# Altium schematic symbol library AD_Lib.SchLib: 1239 symbols (part 7 of 9) (continued)
## R0805_680/150V@2
designator R?, comment 680¦¸,0.125W
ÌùÆ¬µç×è; Manufacturer: Panasonic; pro-environment: RoHS; Quality: -55~155¡æ; other: 680¦¸,0.125W,1%,150V; OPN: ERJ-6ENF6800V; PadsNum: 2; SN: SN; Category: µç×è; Part: ERJ-6ENF6800V; Value: 680¦¸,0.125W; Price: ?; OPN_JLC: 0805W8F6800T5E; SN_JLC: C17798; Price_JLC: 0
footprint R0805 (ÌùÆ¬µç×è£¬¹¦ÂÊ1/8W)
pins: 1, 2

## R0805_806/150V@3
designator R?, comment 806¦¸,0.125W
ÌùÆ¬µç×è; Manufacturer: Viking; pro-environment: RoHS; Quality: -55~155¡æ; other: 806¦¸,0.125W,1%,150V; OPN: ARG05FTC8060N; PadsNum: 2; SN: SN; Category: µç×è; Part: ARG05FTC8060N; Value: 806¦¸,0.125W; QTY: 5000; Price: 0.035102; OPN_JLC: ARG05FTC8060N; SN_JLC: C218702; Price_JLC: 0.035102
footprint R0805 (ÌùÆ¬µç×è£¬¹¦ÂÊ1/8W)
pins: 1, 2

## R1206_0.15/200V
designator R?, comment 0.15,0.25W
ÌùÆ¬µç×è; Manufacturer: Yageo; pro-environment: RoHS; Quality: -55~155¡æ; other: 0.15,0.25W,1%,200V; OPN: RL1206FR-070R15L; PadsNum: 2; SN: SN; Category: µç×è; Part: RL1206FR-070R15L; Value: 0.15,0.25W; QTY: 5000; Price: 0.08147; OPN_JLC: 1206W4F150LT5E; SN_JLC: C37936; Price_JLC: 0.04612
footprint R1206 (¹«ÖÆ3216£»Ó¢ÖÆ1206£»)
pins: 1, 2

## R1206_0.33/200V
designator R?, comment 0.33,0.25W
ÌùÆ¬µç×è; Manufacturer: Yageo; pro-environment: RoHS; Quality: -55~155¡æ; other: 0.15,0.25W,1%,200V; OPN: RL1206FR-070R33L; PadsNum: 2; SN: SN; Category: µç×è; Part: RL1206FR-070R33L; Value: 0.33,0.25W; QTY: 5000; Price: 0.093385; OPN_JLC: 1206W4F330LT5E; SN_JLC: C25337; Price_JLC: 0.047434
footprint R1206 (¹«ÖÆ3216£»Ó¢ÖÆ1206£»)
pins: 1, 2

## R1206_0/1kV
designator R?, comment 0¦¸,0.25W
ÌùÆ¬µç×è; Manufacturer: KOA; pro-environment: RoHS; Quality: -55~155¡æ; OPN: RK73Z2BTTD; PadsNum: 2; SN: SN; other: 0¦¸; Category: µç×è; Part: RK73Z2BTTD; Value: 0¦¸,0.25W; QTY: 5000; Price: 0.03861; OPN_JLC: 1206W4F0000T5E; SN_JLC: C17888; Price_JLC: 0
footprint R1206 (¹«ÖÆ3216£»Ó¢ÖÆ1206£»)
pins: 1, 2

## R1206_0/1kV@3
designator R?, comment 0¦¸
ÌùÆ¬µç×è; Manufacturer: Yageo; pro-environment: RoHS; Quality: -55~155¡æ; SN: 03.4.38.11.18000001S; OPN: RC1206FR-070RL; PadsNum: 2; other: 0¦¸; Category: µç×è; Part: RC1206FR-070RL; Value: 0¦¸; QTY: 5000; Price: 0.03276; OPN_JLC: 1206W4F0000T5E; SN_JLC: C17888; Price_JLC: 0
footprint R1206 (¹«ÖÆ3216£»Ó¢ÖÆ1206£»)
pins: 1, 2

## R1206_1.6/200V
designator R?, comment 1.6,0.25W
ÌùÆ¬µç×è; Manufacturer: Yageo; pro-environment: RoHS; Quality: -55~155¡æ; other: 1.6,0.25W,1%,200V; OPN: RC1206FR-071R6L; PadsNum: 2; SN: SN; Category: µç×è; Part: RC1206FR-071R6L; Value: 1.6,0.25W; QTY: 5000; Price: 0.049626; OPN_JLC: RC1206FR-071R6L; SN_JLC: C137358; Price_JLC: 0.049626
footprint R1206 (¹«ÖÆ3216£»Ó¢ÖÆ1206£»)
pins: 1, 2

## R1206_1/200V@3
designator R?, comment 1¦¸,0.25W
ÌùÆ¬µç×è; Manufacturer: Yageo; pro-environment: RoHS; Quality: -55~155¡æ; other: 1¦¸,0.25W,1%,200V; OPN: RC1206FR-071RL; PadsNum: 2; SN: SN; Category: µç×è; Part: RC1206FR-071RL; Value: 1¦¸,0.25W; QTY: 5000; Price: 0.04797; OPN_JLC: 1206W4F100KT5E; SN_JLC: C17928; Price_JLC: 0
footprint R1206 (¹«ÖÆ3216£»Ó¢ÖÆ1206£»)
pins: 1, 2

## R1206_1K/200V
designator R?, comment 1k¦¸,0.25W
ÌùÆ¬µç×è; Manufacturer: KOA; pro-environment: RoHS; Quality: -55~155¡æ; other: 1k¦¸,0.25W,1%,200V; OPN: RK73H2BTTD1001F; PadsNum: 2; SN: SN; Category: µç×è; Part: RK73H2BTTD1001F; Value: 1k¦¸,0.25W; QTY: 5000; Price: ?; OPN_JLC: 1206W4F1001T5E; SN_JLC: C4410; Price_JLC: 0
footprint R1206 (¹«ÖÆ3216£»Ó¢ÖÆ1206£»)
pins: 1, 2

## R1206_2.2K/200V
designator R?, comment 2.2k¦¸,0.25W
ÌùÆ¬µç×è; Manufacturer: KOA; Part: RK73H2BTTD2001F; pro-environment: RoHS; Quality: -55~155¡æ; other: 2.2k¦¸,0.25W,1%,200V; OPN: RK73H2BTTD2201F; PadsNum: 2; SN: SN; Category: µç×è; Value: 2.2k¦¸,0.25W; QTY: 5000; Price: 0.05424; OPN_JLC: RC1206FR-072K2L; SN_JLC: C114933; Price_JLC: 0.020038
footprint R1206 (¹«ÖÆ3216£»Ó¢ÖÆ1206£»)
pins: 1, 2

## R1206_2.21K/200V
designator R?, comment 2.21k¦¸,0.25W
ÌùÆ¬µç×è; Manufacturer: KOA; pro-environment: RoHS; Quality: -55~155¡æ; SN: 03.4.38.11.18022202S; other: 2.21k¦¸,0.25W,1%,200V; OPN: RK73H2BTTD2211F; PadsNum: 2; Category: µç×è; Part: RK73H2BTTD2211F; Value: 2.21k¦¸,0.25W; QTY: 5000; Price: 0.04797; OPN_JLC: OPN_JLC; SN_JLC: SN_JLC; Price_JLC: 0
footprint R1206 (¹«ÖÆ3216£»Ó¢ÖÆ1206£»)
pins: 1, 2

## R1206_2.87K/200V
designator R?, comment 2.87k¦¸,0.25W
ÌùÆ¬µç×è; Manufacturer: KOA; pro-environment: RoHS; Quality: -55~155¡æ; other: 2.87k¦¸,0.25W,1%,200V; OPN: RK73H2BTTD2871F; PadsNum: 2; SN: SN; Category: µç×è; Part: RK73H2BTTD2871F; Value: 2.87k¦¸,0.25W; QTY: 5000; Price: ?; OPN_JLC: OPN_JLC; SN_JLC: SN_JLC; Price_JLC: 0
footprint R1206 (¹«ÖÆ3216£»Ó¢ÖÆ1206£»)
pins: 1, 2

## R1206_2K/200V
designator R?, comment 2k¦¸,0.25W
ÌùÆ¬µç×è; Manufacturer: KOA; pro-environment: RoHS; Quality: -55~155¡æ; other: 2k¦¸,0.25W,1%,200V; OPN: RK73H2BTTD2001F; PadsNum: 2; SN: SN; Category: µç×è; Part: RK73H2BTTD2001F; Value: 2k¦¸,0.25W; QTY: 5000; Price: ?; OPN_JLC: 1206W4F2001T5E; SN_JLC: C17944; Price_JLC: 0
footprint R1206 (¹«ÖÆ3216£»Ó¢ÖÆ1206£»)
pins: 1, 2

## R1206_2K/200V@2
designator R?, comment 2k¦¸,0.25W
ÌùÆ¬µç×è; Manufacturer: Panasonic; pro-environment: RoHS; Quality: -55~155¡æ; other: 2k¦¸,0.25W,1%,200V; OPN: ERJ-8ENF2001V; PadsNum: 2; SN: SN; Category: µç×è; Part: ERJ-8ENF2001V; Value: 2k¦¸,0.25W; Price: ?; OPN_JLC: 1206W4F2001T5E; SN_JLC: C17944; Price_JLC: 0
footprint R1206 (¹«ÖÆ3216£»Ó¢ÖÆ1206£»)
pins: 1, 2

## R1206_2K/200V@3
designator R?, comment 2K¦¸,0.25W
ÌùÆ¬µç×è; Manufacturer: Yageo; pro-environment: RoHS; Quality: -55~155¡æ; other: 2K¦¸,0.25W,1%,200V; OPN: RC1206FR-072KL; PadsNum: 2; SN: SN; Category: µç×è; Part: RC1206FR-072KL; Value: 2K¦¸,0.25W; QTY: 5000; Price: ?; OPN_JLC: 1206W4F2001T5E; SN_JLC: C17944; Price_JLC: 0
footprint R1206 (¹«ÖÆ3216£»Ó¢ÖÆ1206£»)
pins: 1, 2

## R1206_3.3/200V
designator R?, comment 3.3¦¸,0.25W
ÌùÆ¬µç×è; Manufacturer: KOA; pro-environment: RoHS; Quality: -55~155¡æ; SN: 03.4.38.11.1803R301S; other: 3.3¦¸,0.25W,1%,200V; OPN: RK73H2BTTD3R30F; PadsNum: 2; Category: µç×è; Part: RK73H2BTTD3R30F; Value: 3.3¦¸,0.25W; QTY: 5000; Price: 0.0585; OPN_JLC: OPN_JLC; SN_JLC: SN_JLC; Price_JLC: 0
footprint R1206 (¹«ÖÆ3216£»Ó¢ÖÆ1206£»¹¦ÂÊ1/4W)
pins: 1, 2

## R1206_3.3K/200V@3
designator R?, comment 3.3k¦¸,0.25W
ÌùÆ¬µç×è; Manufacturer: Yageo; pro-environment: RoHS; Quality: -55~155¡æ; other: 3.3k¦¸,0.25W,1%,200V; OPN: RC1206FR-073K3L; PadsNum: 2; SN: SN; Category: µç×è; Part: RC1206FR-073K3L; Value: 3.3k¦¸,0.25W; QTY: 5000; Price: 0.03042; OPN_JLC: OPN_JLC; SN_JLC: SN_JLC; Price_JLC: 0
footprint R1206 (¹«ÖÆ3216£»Ó¢ÖÆ1206£»¹¦ÂÊ1/4W)
pins: 1, 2

## R1206_3.32K/200V
designator R?, comment 3.32k¦¸,0.25W
ÌùÆ¬µç×è; Manufacturer: KOA; pro-environment: RoHS; Quality: -55~155¡æ; other: 3.32k¦¸,0.25W,1%,200V; OPN: RK73H2BTTD3321F; PadsNum: 2; SN: SN; Category: µç×è; Part: RK73H2BTTD3321F; Value: 3.32k¦¸,0.25W; QTY: 5000; Price: 0.04563; OPN_JLC: OPN_JLC; SN_JLC: SN_JLC; Price_JLC: 0
footprint R1206 (¹«ÖÆ3216£»Ó¢ÖÆ1206£»¹¦ÂÊ1/4W)
pins: 1, 2

## R1206_3/200V
designator R?, comment 3¦¸,0.25W
ÌùÆ¬µç×è; Manufacturer: KOA; pro-environment: RoHS; Quality: -55~155¡æ; SN: 03.4.38.11.1803R001S; other: 3¦¸,0.25W,1%,200V; OPN: RK73H2BTTD3R00F; PadsNum: 2; Category: µç×è; Part: RK73H2BTTD3R00F; Value: 3¦¸,0.25W; QTY: 5000; Price: 0.06669; OPN_JLC: OPN_JLC; SN_JLC: SN_JLC; Price_JLC: 0
footprint R1206 (¹«ÖÆ3216£»Ó¢ÖÆ1206£»¹¦ÂÊ1/4W)
pins: 1, 2

## R1206_4.02K/200V
designator R?, comment 4.02k¦¸,0.25W
ÌùÆ¬µç×è; Manufacturer: KOA; pro-environment: RoHS; Quality: -55~155¡æ; other: 4.02k¦¸,0.25W,1%,200V; OPN: RK73H2BTTD4021F; PadsNum: 2; SN: SN; Category: µç×è; Part: RK73H2BTTD4021F; Value: 4.02k¦¸,0.25W; QTY: 5000; Price: 0.04563; OPN_JLC: OPN_JLC; SN_JLC: SN_JLC; Price_JLC: 0
footprint R1206 (¹«ÖÆ3216£»Ó¢ÖÆ1206£»¹¦ÂÊ1/4W)
pins: 1, 2

## R1206_4.75K/200V
designator R?, comment 4.75k¦¸,0.25W
ÌùÆ¬µç×è; Manufacturer: KOA; pro-environment: RoHS; Quality: -55~155¡æ; other: 4.75k¦¸,0.25W,1%,200V; OPN: RK73H2BTTD4751F; PadsNum: 2; SN: SN; Category: µç×è; Part: RK73H2BTTD4751F; Value: 4.75k¦¸,0.25W; QTY: 5000; Price: 0.04563; OPN_JLC: OPN_JLC; SN_JLC: SN_JLC; Price_JLC: 0
footprint R1206 (¹«ÖÆ3216£»Ó¢ÖÆ1206£»¹¦ÂÊ1/4W)
pins: 1, 2

## R1206_5.11K/200V
designator R?, comment 5.11k¦¸,0.25W
ÌùÆ¬µç×è; Manufacturer: KOA; pro-environment: RoHS; Quality: -55~155¡æ; other: 5.11k¦¸,0.25W,1%,200V; OPN: RK73H2BTTD5111F; PadsNum: 2; SN: SN; Category: µç×è; Part: RK73H2BTTD5111F; Value: 5.11k¦¸,0.25W; QTY: 5000; Price: 0.04563; OPN_JLC: OPN_JLC; SN_JLC: SN_JLC; Price_JLC: 0
footprint R1206 (¹«ÖÆ3216£»Ó¢ÖÆ1206£»¹¦ÂÊ1/4W)
pins: 1, 2

## R1206_6.81/200V
designator R?, comment 6.81¦¸,0.25W
ÌùÆ¬µç×è; Manufacturer: KOA; pro-environment: RoHS; Quality: -55~155¡æ; other: 6.81¦¸,0.25W,1%,200V; OPN: RK73H2BTTD6R81F; PadsNum: 2; SN: SN; Category: µç×è; Part: RK73H2BTTD6R81F; Value: 6.81¦¸,0.25W; QTY: 5000; Price: 0.04563; OPN_JLC: OPN_JLC; SN_JLC: SN_JLC; Price_JLC: 0
footprint R1206 (¹«ÖÆ3216£»Ó¢ÖÆ1206£»¹¦ÂÊ1/4W)
pins: 1, 2

## R1206_6.81/200V@3
designator R?, comment 6.81¦¸,0.25W
ÌùÆ¬µç×è; Manufacturer: Yageo; pro-environment: RoHS; Quality: -55~155¡æ; other: 6.81¦¸,0.25W,1%,200V; OPN: RC1206FR-076R81L; PadsNum: 2; SN: SN; Category: µç×è; Part: RC1206FR-076R81L; Value: 6.81¦¸,0.25W; Price: ?; OPN_JLC: OPN_JLC; SN_JLC: SN_JLC; Price_JLC: 0
footprint R1206 (¹«ÖÆ3216£»Ó¢ÖÆ1206£»)
pins: 1, 2

## R1206_8.45K/200V
designator R?, comment 8.45k¦¸,0.25W
ÌùÆ¬µç×è; Manufacturer: KOA; pro-environment: RoHS; Quality: -55~155¡æ; other: 8.45k¦¸,0.25W,1%,200V; OPN: RK73H2BTTD8451F; PadsNum: 2; SN: SN; Category: µç×è; Part: RK73H2BTTD8451F; Value: 8.45k¦¸,0.25W; QTY: 5000; Price: ?; OPN_JLC: OPN_JLC; SN_JLC: SN_JLC; Price_JLC: 0
footprint R1206 (¹«ÖÆ3216£»Ó¢ÖÆ1206£»)
pins: 1, 2

## R1206_10/200V@3
designator R?, comment 10¦¸,0.25W
ÌùÆ¬µç×è; Manufacturer: Yageo; pro-environment: RoHS; Quality: -55~155¡æ; other: 10¦¸,0.25W,1%,200V; OPN: RC1206FR-0710RL; PadsNum: 2; SN: SN; Category: µç×è; Part: RC1206FR-0710RL; Value: 10¦¸,0.25W; Price: ?; OPN_JLC: 1206W4F100JT5E; SN_JLC: C17903; Price_JLC: 0
footprint R1206 (¹«ÖÆ3216£»Ó¢ÖÆ1206£»)
pins: 1, 2

## R1206_10K/200V
designator R?, comment 10k¦¸,0.25W
ÌùÆ¬µç×è; Manufacturer: KOA; pro-environment: RoHS; Quality: -55~155¡æ; SN: 03.4.38.11.18010303S; other: 10k¦¸,0.25W,1%,200V; OPN: RK73H2BTTD1002F; PadsNum: 2; Category: µç×è; Part: RK73H2BTTD1002F; Value: 10k¦¸,0.25W; QTY: 5000; Price: 0.04797; OPN_JLC: 1206W4F1002T5E; SN_JLC: C17902; Price_JLC: 0
footprint R1206 (¹«ÖÆ3216£»Ó¢ÖÆ1206£»)
pins: 1, 2

## R1206_10M/500V
designator R?, comment 10M¦¸,0.25W
ÌùÆ¬µç×è; Manufacturer: KOA; pro-environment: RoHS; Quality: -55~155¡æ; other: 10M¦¸,0.25W,1%,500V; OPN: HV732BTTD1005F; PadsNum: 2; SN: SN; Category: µç×è; Part: HV732BTTD1005F; Value: 10M¦¸,0.25W; QTY: 5000; Price: 1.7628; OPN_JLC: RC1206FR-0710ML; SN_JLC: C275643; Price_JLC: 0.048314
footprint R1206 (¹«ÖÆ3216£»Ó¢ÖÆ1206£»¹¦ÂÊ1/4W)
pins: 1, 2

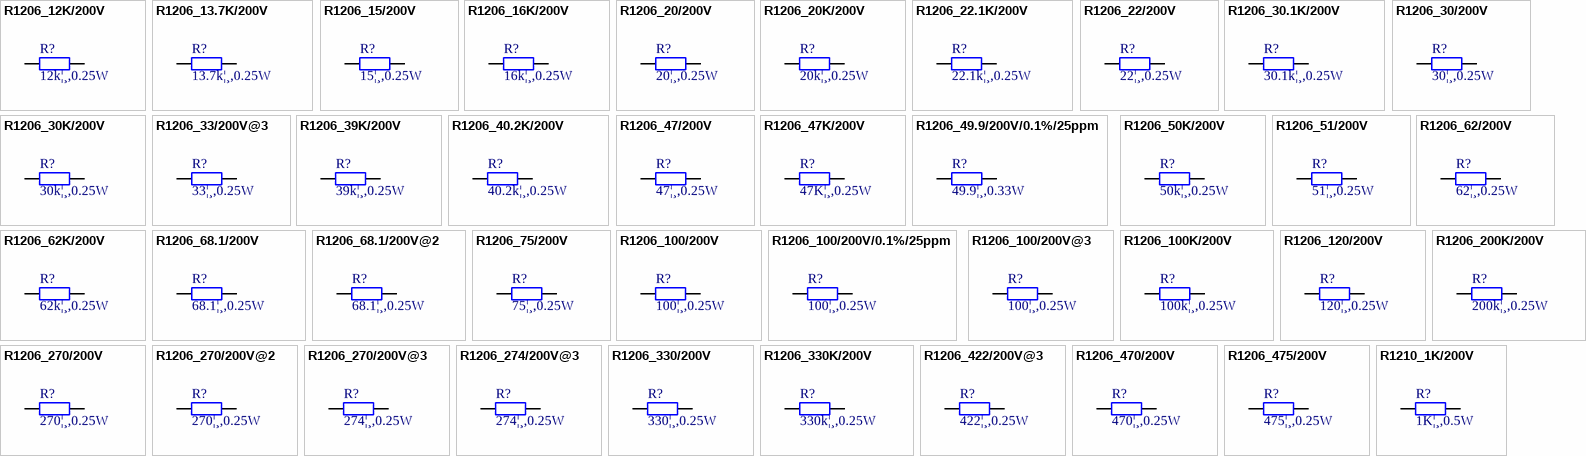
[diagram p34: symbols R1206_12K/200V to R1210_1K/200V]

## R1206_12K/200V
designator R?, comment 12k¦¸,0.25W
ÌùÆ¬µç×è; Manufacturer: KOA; pro-environment: RoHS; Quality: -55~155¡æ; other: 12k¦¸,0.25W,1%,200V; OPN: RK73H2BTTD1202F; PadsNum: 2; SN: SN; Category: µç×è; Part: RK73H2BTTD1202F; Value: 12k¦¸,0.25W; QTY: 5000; Price: ?; OPN_JLC: OPN_JLC; SN_JLC: SN_JLC; Price_JLC: 0
footprint R1206 (¹«ÖÆ3216£»Ó¢ÖÆ1206£»¹¦ÂÊ1/4W)
pins: 1, 2

## R1206_13.7K/200V
designator R?, comment 13.7k¦¸,0.25W
ÌùÆ¬µç×è; Manufacturer: KOA; pro-environment: RoHS; Quality: -55~155¡æ; other: 13.7k¦¸,0.25W,1%,200V; OPN: RK73H2BTTD1372F; PadsNum: 2; SN: SN; Category: µç×è; Part: RK73H2BTTD1372F; Value: 13.7k¦¸,0.25W; QTY: 5000; Price: 0.04563; OPN_JLC: OPN_JLC; SN_JLC: SN_JLC; Price_JLC: 0
footprint R1206 (¹«ÖÆ3216£»Ó¢ÖÆ1206£»)
pins: 1, 2

## R1206_15/200V
designator R?, comment 15¦¸,0.25W
ÌùÆ¬µç×è; Manufacturer: KOA; pro-environment: RoHS; Quality: -55~155¡æ; other: 15¦¸,0.25W,1%,200V; OPN: RK73H2BTTD15R0F; PadsNum: 2; SN: SN; Category: µç×è; Part: RK73H2BTTD15R0F; Value: 15¦¸,0.25W; QTY: 5000; Price: 0.05568; OPN_JLC: OPN_JLC; SN_JLC: SN_JLC; Price_JLC: 0
footprint R1206 (¹«ÖÆ3216£»Ó¢ÖÆ1206£»)
pins: 1, 2

## R1206_16K/200V
designator R?, comment 16k¦¸,0.25W
ÌùÆ¬µç×è; Manufacturer: KOA; pro-environment: RoHS; Quality: -55~155¡æ; SN: 03.4.38.11.18016302S; other: 16k¦¸,0.25W,1%,200V; OPN: RK73H2BTTD1602F; PadsNum: 2; Category: µç×è; Part: RK73H2BTTD1602F; Value: 16k¦¸,0.25W; QTY: 5000; Price: 0.0585; OPN_JLC: OPN_JLC; SN_JLC: SN_JLC; Price_JLC: 0
footprint R1206 (¹«ÖÆ3216£»Ó¢ÖÆ1206£»)
pins: 1, 2

## R1206_20/200V
designator R?, comment 20¦¸,0.25W
ÌùÆ¬µç×è; Manufacturer: KOA; pro-environment: RoHS; Quality: -55~155¡æ; other: 20¦¸,0.25W,1%,200V; OPN: RK73H2BTTD20R0F; PadsNum: 2; SN: SN; Category: µç×è; Part: RK73H2BTTD20R0F; Value: 20¦¸,0.25W; QTY: 5000; Price: ?; OPN_JLC: 1206W4F200JT5E; SN_JLC: C17955; Price_JLC: 0
footprint R1206 (¹«ÖÆ3216£»Ó¢ÖÆ1206£»)
pins: 1, 2

## R1206_20K/200V
designator R?, comment 20k¦¸,0.25W
ÌùÆ¬µç×è; Manufacturer: KOA; pro-environment: RoHS; Quality: -55~155¡æ; other: 20k¦¸,0.25W,1%,200V; OPN: RK73H2BTTD2002F; PadsNum: 2; SN: SN; Category: µç×è; Part: RK73H2BTTD2002F; Value: 20k¦¸,0.25W; QTY: 5000; Price: ?; OPN_JLC: OPN_JLC; SN_JLC: SN_JLC; Price_JLC: 0
footprint R1206 (¹«ÖÆ3216£»Ó¢ÖÆ1206£»¹¦ÂÊ1/4W)
pins: 1, 2

## R1206_22.1K/200V
designator R?, comment 22.1k¦¸,0.25W
ÌùÆ¬µç×è; Manufacturer: KOA; pro-environment: RoHS; Quality: -55~155¡æ; SN: 03.4.38.11.18022202S; other: 22.1k¦¸,0.25W,1%,200V; OPN: RK73H2BTTD2212F; PadsNum: 2; Category: µç×è; Part: RK73H2BTTD2212F; Value: 22.1k¦¸,0.25W; QTY: 5000; Price: 0.05031; OPN_JLC: OPN_JLC; SN_JLC: SN_JLC; Price_JLC: 0
footprint R1206 (¹«ÖÆ3216£»Ó¢ÖÆ1206£»)
pins: 1, 2

## R1206_22/200V
designator R?, comment 22¦¸,0.25W
ÌùÆ¬µç×è; Manufacturer: Yageo; pro-environment: RoHS; Quality: -55~155¡æ; other: 22¦¸,0.25W,1%,200V; OPN: RC1206FR-0722RL; PadsNum: 2; SN: SN; Category: µç×è; Part: RC1206FR-0722RL; Value: 22¦¸,0.25W; QTY: 5000; Price: ?; OPN_JLC: RC1206FR-0722RL; SN_JLC: C114943; Price_JLC: 0.023402
footprint R1206 (¹«ÖÆ3216£»Ó¢ÖÆ1206£»)
pins: 1, 2

## R1206_30.1K/200V
designator R?, comment 30.1k¦¸,0.25W
ÌùÆ¬µç×è; Manufacturer: KOA; pro-environment: RoHS; Quality: -55~155¡æ; other: 30.1k¦¸,0.25W,1%,200V; OPN: RK73H2BTTD3012F; PadsNum: 2; SN: SN; Category: µç×è; Part: RK73H2BTTD3012F; Value: 30.1k¦¸,0.25W; QTY: 5000; Price: ?; OPN_JLC: OPN_JLC; SN_JLC: SN_JLC; Price_JLC: 0
footprint R1206 (¹«ÖÆ3216£»Ó¢ÖÆ1206£»¹¦ÂÊ1/4W)
pins: 1, 2

## R1206_30/200V
designator R?, comment 30¦¸,0.25W
ÌùÆ¬µç×è; Manufacturer: KOA; pro-environment: RoHS; Quality: -55~155¡æ; other: 30¦¸,0.25W,1%,200V; OPN: RK73H2BTTD30R0F; PadsNum: 2; SN: SN; Category: µç×è; Part: RK73H2BTTD30R0F; Value: 30¦¸,0.25W; QTY: 5000; Price: 0.04797; OPN_JLC: OPN_JLC; SN_JLC: SN_JLC; Price_JLC: 0
footprint R1206 (¹«ÖÆ3216£»Ó¢ÖÆ1206£»¹¦ÂÊ1/4W)
pins: 1, 2

## R1206_30K/200V
designator R?, comment 30k¦¸,0.25W
ÌùÆ¬µç×è; Manufacturer: KOA; pro-environment: RoHS; Quality: -55~155¡æ; other: 30k¦¸,0.25W,1%,200V; OPN: RK73H2BRTTD3002F; PadsNum: 2; SN: SN; Category: µç×è; Part: RK73H2BRTTD3002F; Value: 30k¦¸,0.25W; QTY: 5000; Price: ?; OPN_JLC: OPN_JLC; SN_JLC: SN_JLC; Price_JLC: 0
footprint R1206 (¹«ÖÆ3216£»Ó¢ÖÆ1206£»¹¦ÂÊ1/4W)
pins: 1, 2

## R1206_33/200V@3
designator R?, comment 33¦¸,0.25W
ÌùÆ¬µç×è; Manufacturer: Yageo; pro-environment: RoHS; Quality: -55~155¡æ; other: 33¦¸,0.25W,5%,200V; OPN: RC1206JR-0733RL; PadsNum: 2; SN: SN; Category: µç×è; Part: RC1206JR-0733RL; Value: 33¦¸,0.25W; QTY: 5000; Price: ?; OPN_JLC: OPN_JLC; SN_JLC: SN_JLC; Price_JLC: 0
footprint R1206 (¹«ÖÆ3216£»Ó¢ÖÆ1206£»)
pins: 1, 2

## R1206_39K/200V
designator R?, comment 39k¦¸,0.25W
ÌùÆ¬µç×è; Manufacturer: KOA; pro-environment: RoHS; Quality: -55~155¡æ; other: 39k¦¸,0.25W,1%,200V; OPN: RK73H2BTTD3902F; PadsNum: 2; SN: SN; Category: µç×è; Part: RK73H2BTTD3902F; Value: 39k¦¸,0.25W; Price: ?; OPN_JLC: OPN_JLC; SN_JLC: SN_JLC; Price_JLC: 0
footprint R1206 (¹«ÖÆ3216£»Ó¢ÖÆ1206£»¹¦ÂÊ1/4W)
pins: 1, 2

## R1206_40.2K/200V
designator R?, comment 40.2k¦¸,0.25W
ÌùÆ¬µç×è; Manufacturer: KOA; pro-environment: RoHS; Quality: -55~155¡æ; other: 40.2k¦¸,0.25W,1%,200V; OPN: RK73H2BTTD4022F; PadsNum: 2; SN: SN; Category: µç×è; Part: RK73H2BTTD4022F; Value: 40.2k¦¸,0.25W; QTY: 5000; Price: ?; OPN_JLC: OPN_JLC; SN_JLC: SN_JLC; Price_JLC: 0
footprint R1206 (¹«ÖÆ3216£»Ó¢ÖÆ1206£»¹¦ÂÊ1/4W)
pins: 1, 2

## R1206_47/200V
designator R?, comment 47¦¸,0.25W
ÌùÆ¬µç×è; Manufacturer: KOA; pro-environment: RoHS; Quality: -55~155¡æ; other: 47¦¸,0.25W,1%,200V; OPN: RK73H2BTTD47R0F; PadsNum: 2; SN: SN; Category: µç×è; Part: RK73H2BTTD47R0F; Value: 47¦¸,0.25W; QTY: 5000; Price: 0.04563; OPN_JLC: OPN_JLC; SN_JLC: SN_JLC; Price_JLC: 0
footprint R1206 (¹«ÖÆ3216£»Ó¢ÖÆ1206£»)
pins: 1, 2

## R1206_47K/200V
designator R?, comment 47K¦¸,0.25W
ÌùÆ¬µç×è; Manufacturer: KOA; pro-environment: RoHS; Quality: -55~155¡æ; SN: 03.4.38.11.18047301S; other: 47K¦¸,0.25W,1%,200V; OPN: RK73H2BTTD4702F; PadsNum: 2; Category: µç×è; Part: RK73H2BTTD4702F; Value: 47K¦¸,0.25W; QTY: 5000; Price: 0.04797; OPN_JLC: OPN_JLC; SN_JLC: SN_JLC; Price_JLC: 0
footprint R1206 (¹«ÖÆ3216£»Ó¢ÖÆ1206£»)
pins: 1, 2

## R1206_49.9/200V/0.1%/25ppm
designator R?, comment 49.9¦¸,0.33W
ÌùÆ¬µç×è; Manufacturer: Viking; pro-environment: RoHS; Quality: -55~155¡æ; other: 49.9¦¸,0.33W,0.1%,200V; OPN: AR06BTCO49R9; PadsNum: 2; SN: SN; Category: µç×è; Part: AR06BTCO49R9; Value: 49.9¦¸,0.33W; QTY: 5000; Price: 0.255102; OPN_JLC: AR06BTCO49R9; SN_JLC: C374788; Price_JLC: 0.255102
footprint R1206 (¹«ÖÆ3216£»Ó¢ÖÆ1206£»)
pins: 1, 2

## R1206_50K/200V
designator R?, comment 50k¦¸,0.25W
ÌùÆ¬µç×è; Manufacturer: UNI-ROYAL; pro-environment: RoHS; Quality: -55~155¡æ; other: 50k¦¸,0.25W,1%,200V; OPN: 1206W4F150KT5E; PadsNum: 2; SN: SN; Category: µç×è; Part: 1206W4F150KT5E; Value: 50k¦¸,0.25W; QTY: 5000; Price: 0.020723; OPN_JLC: RC1206FR-07150KL; SN_JLC: C114931; Price_JLC: 0.018731
footprint R1206 (¹«ÖÆ3216£»Ó¢ÖÆ1206£»)
pins: 1, 2

## R1206_51/200V
designator R?, comment 51¦¸,0.25W
ÌùÆ¬µç×è; Manufacturer: KOA; pro-environment: RoHS; Quality: -55~155¡æ; other: 51¦¸,0.25W,1%,200V; OPN: RK73H2BTTD51R0F; PadsNum: 2; SN: SN; Category: µç×è; Part: RK73H2BTTD51R0F; Value: 51¦¸,0.25W; QTY: 5000; Price: 0.05031; OPN_JLC: OPN_JLC; SN_JLC: SN_JLC; Price_JLC: 0
footprint R1206 (¹«ÖÆ3216£»Ó¢ÖÆ1206£»¹¦ÂÊ1/4W)
pins: 1, 2

## R1206_62/200V
designator R?, comment 62¦¸,0.25W
ÌùÆ¬µç×è; Manufacturer: KOA; pro-environment: RoHS; Quality: -55~155¡æ; other: 62¦¸,0.25W,1%,200V; OPN: RK73H2BTTD62R0F; PadsNum: 2; SN: SN; Category: µç×è; Part: RK73H2BTTD62R0F; Value: 62¦¸,0.25W; QTY: 5000; Price: 0.04797; OPN_JLC: OPN_JLC; SN_JLC: SN_JLC; Price_JLC: 0
footprint R1206 (¹«ÖÆ3216£»Ó¢ÖÆ1206£»)
pins: 1, 2

## R1206_62K/200V
designator R?, comment 62k¦¸,0.25W
ÌùÆ¬µç×è; Manufacturer: KOA; pro-environment: RoHS; Quality: -55~155¡æ; other: 62k¦¸,0.25W,1%,200V; OPN: RK73H2BTTD6202F; PadsNum: 2; SN: SN; Category: µç×è; Part: RK73H2BTTD6202F; Value: 62k¦¸,0.25W; QTY: 5000; Price: 0.04797; OPN_JLC: OPN_JLC; SN_JLC: SN_JLC; Price_JLC: 0
footprint R1206 (¹«ÖÆ3216£»Ó¢ÖÆ1206£»¹¦ÂÊ1/4W)
pins: 1, 2

## R1206_68.1/200V
designator R?, comment 68.1¦¸,0.25W
ÌùÆ¬µç×è; Manufacturer: KOA; pro-environment: RoHS; Quality: -55~155¡æ; other: 68.1¦¸,0.25W,1%,200V; OPN: RK73H2BTTD68R1F; PadsNum: 2; SN: SN; Category: µç×è; Part: RK73H2BTTD68R1F; Value: 68.1¦¸,0.25W; QTY: 5000; Price: 0.04563; OPN_JLC: OPN_JLC; SN_JLC: SN_JLC; Price_JLC: 0
footprint R1206 (¹«ÖÆ3216£»Ó¢ÖÆ1206£»)
pins: 1, 2

## R1206_68.1/200V@2
designator R?, comment 68.1¦¸,0.25W
ÌùÆ¬µç×è; Manufacturer: Panasonic; pro-environment: RoHS; Quality: -55~155¡æ; other: 68.1¦¸,0.25W,1%,200V; OPN: ERJ-8ENF68R1V; PadsNum: 2; SN: SN; Category: µç×è; Part: ERJ-8ENF68R1V; Value: 68.1¦¸,0.25W; Price: ?; OPN_JLC: OPN_JLC; SN_JLC: SN_JLC; Price_JLC: 0
footprint R1206 (¹«ÖÆ3216£»Ó¢ÖÆ1206£»)
pins: 1, 2

## R1206_75/200V
designator R?, comment 75¦¸,0.25W
ÌùÆ¬µç×è; Manufacturer: KOA; pro-environment: RoHS; Quality: -55~155¡æ; other: 75¦¸,0.25W,1%,200V; OPN: RK73H2BTTD75R0F; PadsNum: 2; SN: SN; Category: µç×è; Part: RK73H2BTTD75R0F; Value: 75¦¸,0.25W; QTY: 5000; Price: 0.04563; OPN_JLC: OPN_JLC; SN_JLC: SN_JLC; Price_JLC: 0
footprint R1206 (¹«ÖÆ3216£»Ó¢ÖÆ1206£»¹¦ÂÊ1/4W)
pins: 1, 2

## R1206_100/200V
designator R?, comment 100¦¸,0.25W
ÌùÆ¬µç×è; Manufacturer: KOA; pro-environment: RoHS; Quality: -55~155¡æ; other: 100¦¸,0.25W,1%,200V; OPN: RK73H2BTTD1000F; PadsNum: 2; SN: SN; Category: µç×è; Part: RK73H2BTTD1000F; Value: 100¦¸,0.25W; QTY: 5000; Price: 0.05031; OPN_JLC: 1206W4F1000T5E; SN_JLC: C17901; Price_JLC: 0
footprint R1206 (¹«ÖÆ3216£»Ó¢ÖÆ1206£»¹¦ÂÊ1/4W)
pins: 1, 2

## R1206_100/200V/0.1%/25ppm
designator R?, comment 100¦¸,0.25W
ÌùÆ¬µç×è; 0.1%; 25ppm; Manufacturer: FH; pro-environment: RoHS; Quality: -55~155¡æ; other: 100¦¸,0.25W,0.1%,200V; OPN: TF06G1000BT; PadsNum: 2; SN: SN; Category: µç×è; Part: TF06G1000BT; Value: 100¦¸,0.25W; QTY: 5000; Price: 0.310422; OPN_JLC: TF06G1000BT; SN_JLC: C880257; Price_JLC: 0.310422
footprint R1206 (¹«ÖÆ3216£»Ó¢ÖÆ1206£»¹¦ÂÊ1/4W)
pins: 1, 2

## R1206_100/200V@3
designator R?, comment 100¦¸,0.25W
ÌùÆ¬µç×è; Manufacturer: Yageo; pro-environment: RoHS; Quality: -55~155¡æ; other: 100¦¸,0.25W,1%,200V; OPN: RC1206FR-07100RL; PadsNum: 2; SN: SN; Category: µç×è; Part: RC1206FR-07100RL; Value: 100¦¸,0.25W; QTY: 5000; Price: 0.03042; OPN_JLC: 1206W4F1000T5E; SN_JLC: C17901; Price_JLC: 0
footprint R1206 (¹«ÖÆ3216£»Ó¢ÖÆ1206£»¹¦ÂÊ1/4W)
pins: 1, 2